# Altium footprint library SIM-Memory_Card Connectors.PcbLib: 17 footprints (part 2 of 2)
Each footprint in its own frame and in the unit in brackets; x right, y up, seen from the top. Pads: shape width x height; smd on the part's side, far side on the other; paste and mask are expansions set on the pad; w line width, h text height; cw(c..) or ccw(c..) is an arc to the next point about the centre after c.
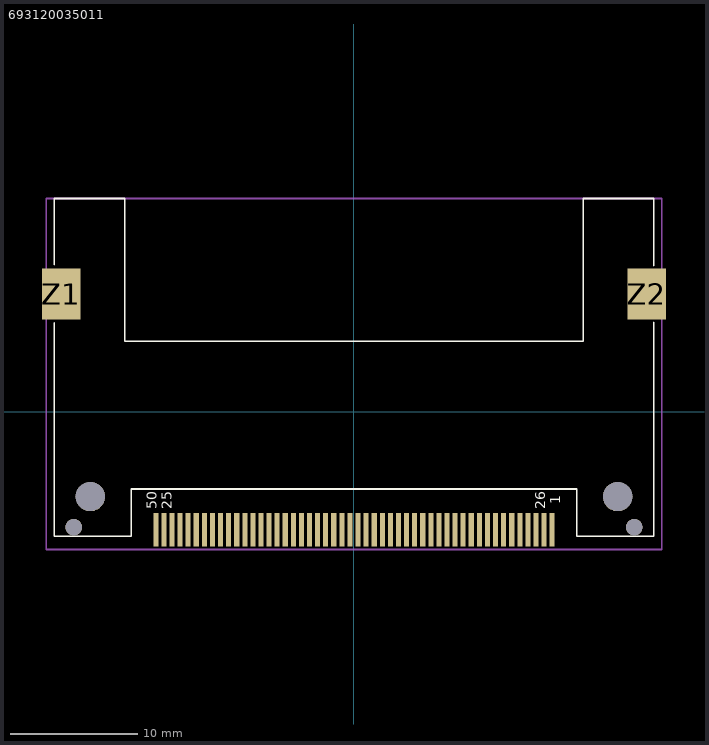
[diagram p1: the footprint, top view; thin cyan lines are the x and y axes]

## 693120035011 [mm] "WR-CRD Compact Flash_Shrouded _50 pins"
height 6.8
pads (56):
  rect 0.4x2.6 smd: 1(15.558,-9.25) 2(14.288,-9.25) 3(13.018,-9.25) 4(11.748,-9.25) 5(10.478,-9.25) 6(9.208,-9.25) 7(7.938,-9.25) 8(6.668,-9.25) 9(5.398,-9.25) 10(4.128,-9.25) 11(2.858,-9.25) 12(1.588,-9.25) 13(0.318,-9.25) 14(-0.952,-9.25) 15(-2.222,-9.25) 16(-3.492,-9.25) 17(-4.762,-9.25) 18(-6.032,-9.25) 19(-7.302,-9.25) 20(-8.572,-9.25) 21(-9.842,-9.25) 22(-11.112,-9.25) 23(-12.382,-9.25) 24(-13.652,-9.25) 25(-14.922,-9.25) 26(14.923,-9.25) 27(13.653,-9.25) 28(12.383,-9.25) 29(11.113,-9.25) 30(9.843,-9.25) 31(8.573,-9.25) 32(7.303,-9.25) 33(6.033,-9.25) 34(4.763,-9.25) 35(3.493,-9.25) 36(2.223,-9.25) 37(0.953,-9.25) 38(-0.317,-9.25) 39(-1.587,-9.25) 40(-2.857,-9.25) 41(-4.127,-9.25) 42(-5.397,-9.25) 43(-6.667,-9.25) 44(-7.937,-9.25) 45(-9.207,-9.25) 46(-10.477,-9.25) 47(-11.747,-9.25) 48(-13.017,-9.25) 49(-14.287,-9.25) 50(-15.557,-9.25)
  rect 3x4 smd: Z1(-22.98,9.25) Z2(22.98,9.25)
  round 1.3 hole 1.3 unplated: ""(-22.002,-9.05) ""(21.998,-9.05)
  round 2.3 hole 2.3 unplated: ""(-20.702,-6.65) ""(20.698,-6.65)
Top Overlay:
  lines w0.127: -23.537,6.988 -23.537,-9.75 -17.5,-9.75 -17.5,-6.05 17.5,-6.05 17.5,-9.75 23.538,-9.75 23.538,7.038 ; -23.537,11.563 -23.537,16.75 -18.002,16.75 -18.002,5.55 17.998,5.55 17.998,16.75 23.538,16.75 23.538,11.487
  text "25" at -14.302,-7.65 h0.8
  text "26" at 14.998,-7.65 h0.8
  text "50" at -15.502,-7.65 h0.8
  text "1" at 16.198,-7.25 h0.8
Mechanical 15:
  lines w0.127: -24.15,-10.8 -24.15,16.75 24.15,16.75 24.15,-10.8 -24.15,-10.8
3D body "693120035011.stp": height 6.8, standoff -0.6, extent -23.8,-9.75 23.8,16.75